# Altium footprint library PcbLib1.PcbLib: 1 footprints
Each footprint in its own frame and in the unit in brackets; x right, y up, seen from the top. Pads: shape width x height; smd on the part's side, far side on the other; paste and mask are expansions set on the pad; w line width, h text height; cw(c..) or ccw(c..) is an arc to the next point about the centre after c.

## PCBComponent_1 [mm]
3D body "actuator.step": height 20.53, standoff -3.96, extent -18.288,-20.831 76.581,60.071
3D body "ota.step": height 18.78, standoff -5.75, extent -18.296,-18.039 81.504,60.193
3D body "sensor.step": height 19.53, standoff -10.9, extent -18.669,-18.252 76.331,63.21